# Altium footprint library IC.PCBLIB: 359 footprints (part 12 of 23)
Each footprint in its own frame and in the unit in brackets; x right, y up, seen from the top. Pads: shape width x height; smd on the part's side, far side on the other; paste and mask are expansions set on the pad; w line width, h text height; cw(c..) or ccw(c..) is an arc to the next point about the centre after c.
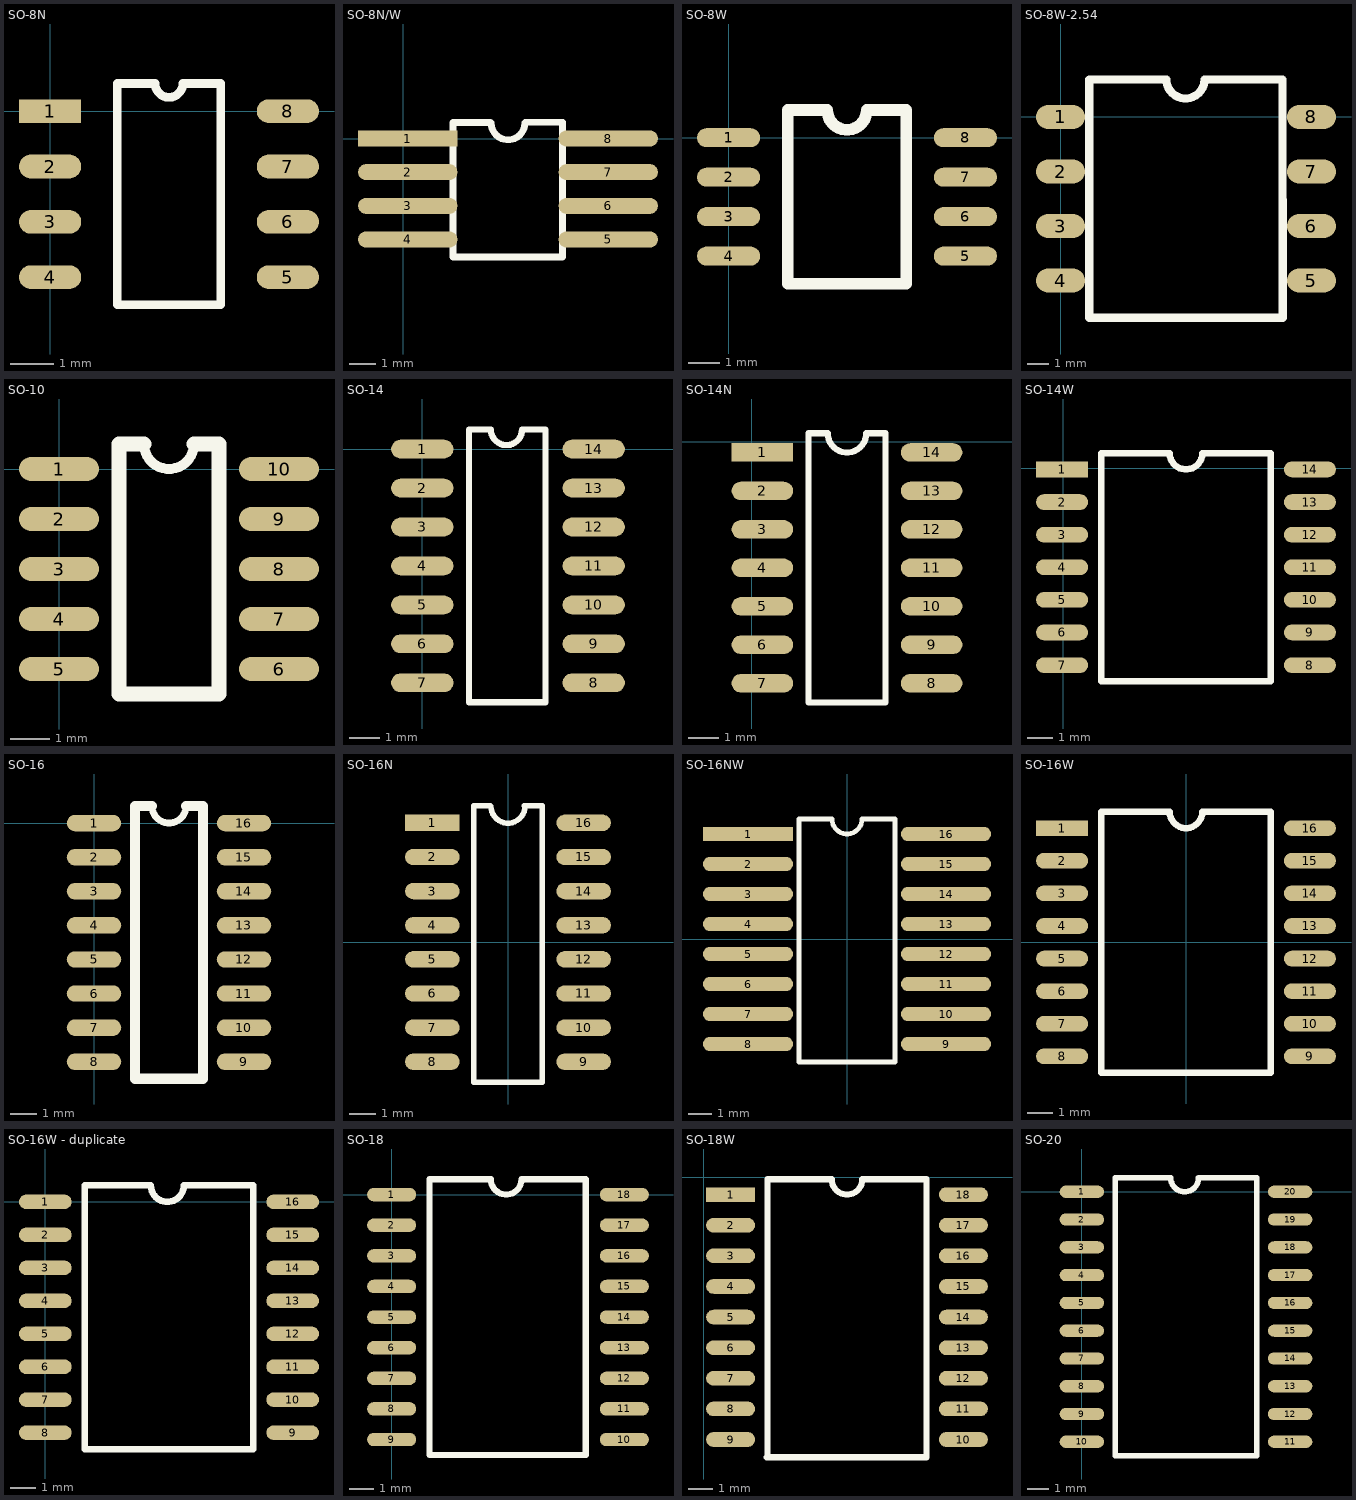
[diagram p11: the footprints below, top view; thin cyan lines are the x and y axes]

## SO-8N [mm]
pads (8):
  rect 1.44x0.55 smd: 1(0,0)
  oval 1.44x0.55 smd: 2(0,-1.28) 3(0,-2.56) 4(0,-3.84) 5(5.5,-3.84) 6(5.5,-2.56) 7(5.5,-1.28) 8(5.5,0)
TopOverlay:
  lines w0.2: 1.555,-4.48 3.945,-4.48 3.945,0.64 3.07,0.64 cw(c2.75,0.64) 2.43,0.64 1.555,0.64 1.555,-4.48

## SO-8N/W [mil]
height 590.55
pads (8):
  rect 147.64x24 smd: 1(6.97,0)
  oval 147.64x24 smd: 2(6.97,-50) 3(6.97,-100) 4(6.97,-150) 5(305,-150) 6(305,-100) 7(305,-50) 8(305,0)
TopOverlay:
  lines w10: 130.06,23.94 74.39,23.94 74.39,-176.06 237.01,-176.06 ; 131,23 ccw(c156,23) 181,23 ; 182,24 237.01,24 ; 236.01,23 237.01,24 ; 237.01,-176 237.01,24

## SO-8W [mil]
pads (8):
  oval 80x24 smd: 1(0,0) 2(0,-50) 3(0,-100) 4(0,-150) 5(300,-150) 6(300,-100) 7(300,-50) 8(300,0)
TopOverlay:
  lines w15: 75,-185 225,-185 225,35 175,35 cw(c150,35) 125,35 75,35 75,-185

## SO-8W-2.54 [mil]
pads (8):
  oval 90x44 smd: 1(0,0) 2(0,-100) 3(0,-200) 4(0,-300) 5(460,-300) 6(460,-200) 7(460,-100) 8(460,0)
TopOverlay:
  lines w15: 52.67,-368.01 52.67,69 194,69 ccw(c229,69) 264,69 407,69 407.33,-368.01 52.67,-368.01

## SO-10 [mil]
pads (10):
  oval 80x24 smd: 1(0,0) 2(0,-50) 3(0,-100) 4(0,-150) 5(0,-200) 6(220,-200) 7(220,-150) 8(220,-100) 9(220,-50) 10(220,0)
TopOverlay:
  lines w10: 85,25 ccw(c110,25) 135,25
  lines w15: 85,25 60,25 60,-225 160,-225 160,25 135,25

## SO-14 [mil]
pads (14):
  oval 80x24 smd: 1(0,0) 2(0,-50) 3(0,-100) 4(0,-150) 5(0,-200) 6(0,-250) 7(0,-300) 8(220,-300) 9(220,-250) 10(220,-200) 11(220,-150) 12(220,-100) 13(220,-50) 14(220,0)
TopOverlay:
  lines w8: 60,-325 158,-325 158,25 128,25 cw(c108,25) 88,25 60,25 60,-325

## SO-14N [mil]
pads (14):
  rect 80x24 smd: 1(14,-14)
  oval 80x24 smd: 2(14,-64) 3(14,-114) 4(14,-164) 5(14,-214) 6(14,-264) 7(14,-314) 8(234,-314) 9(234,-264) 10(234,-214) 11(234,-164) 12(234,-114) 13(234,-64) 14(234,-14)
TopOverlay:
  lines w8: 74,-339 174,-339 174,11 149,11 cw(c124,11) 99,11 74,11 74,-339

## SO-14W [mil]
pads (14):
  rect 80x24 smd: 1(-2,-2)
  oval 80x24 smd: 2(-2,-52) 3(-2,-102) 4(-2,-152) 5(-2,-202) 6(-2,-252) 7(-2,-302) 8(378,-302) 9(378,-252) 10(378,-202) 11(378,-152) 12(378,-102) 13(378,-52) 14(378,-2)
TopOverlay:
  lines w10: 58,-327 58,23 163,23 ccw(c188,23) 213,23 318,23 318,-327 58,-327

## SO-16 [mil]
pads (16):
  oval 80x24 smd: 1(0,0) 2(0,-50) 3(0,-100) 4(0,-150) 5(0,-200) 6(0,-250) 7(0,-300) 8(0,-350) 9(220,-350) 10(220,-300) 11(220,-250) 12(220,-200) 13(220,-150) 14(220,-100) 15(220,-50) 16(220,0)
TopOverlay:
  lines w10: 85,25 ccw(c110,25) 135,25
  lines w15: 85,25 60,25 60,-375 160,-375 160,25 135,25

## SO-16N [mil]
pads (16):
  rect 80x24 smd: 1(-110.95,175)
  oval 80x24 smd: 2(-110.95,125) 3(-110.95,75) 4(-110.95,25) 5(-110.95,-25) 6(-110.95,-75) 7(-110.95,-125) 8(-110.95,-175) 9(110.95,-175) 10(110.95,-125) 11(110.95,-75) 12(110.95,-25) 13(110.95,25) 14(110.95,75) 15(110.95,125) 16(110.95,175)
TopOverlay:
  lines w8: -50.05,199.62 -50.05,-205 49.95,-205 49.95,199.62 ; -50.05,200 -25.95,200 ; -25.05,199.62 ccw(c-0.05,199.62) 24.95,199.62 ; 24.05,200 49.95,200

## SO-16NW [mil]
height 590.55
pads (16):
  rect 150x24 smd: 1(-165,175)
  oval 150x24 smd: 2(-165,125) 3(-165,75) 4(-165,25) 5(-165,-25) 6(-165,-75) 7(-165,-125) 8(-165,-175) 9(165,-175) 10(165,-125) 11(165,-75) 12(165,-25) 13(165,25) 14(165,75) 15(165,125) 16(165,175)
TopOverlay:
  lines w8: -80,-205 -80,200 -25,200 ccw(c0,200) 25,200 80,200 80,-205 -80,-205

## SO-16W [mil]
pads (16):
  rect 80x24 smd: 1(-190,175)
  oval 80x24 smd: 2(-190,125) 3(-190,75) 4(-190,25) 5(-190,-25) 6(-190,-75) 7(-190,-125) 8(-190,-175) 9(190,-175) 10(190,-125) 11(190,-75) 12(190,-25) 13(190,25) 14(190,75) 15(190,125) 16(190,175)
TopOverlay:
  lines w10: -25.28,200 -130,200 -130,-200 130,-200 130,200 25,200 cw(c0,200) -25,200

## SO-16W - duplicate [mil]
pads (16):
  oval 80x22 smd: 1(0,0) 2(0,-50) 3(0,-100) 4(0,-150) 5(0,-200) 6(0,-250) 7(0,-300) 8(0,-350) 9(375,-350) 10(375,-300) 11(375,-250) 12(375,-200) 13(375,-150) 14(375,-100) 15(375,-50) 16(375,0)
TopOverlay:
  lines w10: 60,-375 315,-375 315,25 210,25 cw(c185,25) 160,25 60,25 60,-375

## SO-18 [mil]
pads (18):
  oval 80x22 smd: 1(0,0) 2(0,-50) 3(0,-100) 4(0,-150) 5(0,-200) 6(0,-250) 7(0,-300) 8(0,-350) 9(0,-400) 10(380,-400) 11(380,-350) 12(380,-300) 13(380,-250) 14(380,-200) 15(380,-150) 16(380,-100) 17(380,-50) 18(380,0)
TopOverlay:
  lines w10: 62,-425 62,25 162,25 ccw(c187,25) 212,25 317,25 317,-425 62,-425

## SO-18W [mil]
pads (18):
  rect 80x24 smd: 1(44,-28)
  oval 80x24 smd: 2(44,-78) 3(44,-128) 4(44,-178) 5(44,-228) 6(44,-278) 7(44,-328) 8(44,-378) 9(44,-428) 10(424,-428) 11(424,-378) 12(424,-328) 13(424,-278) 14(424,-228) 15(424,-178) 16(424,-128) 17(424,-78) 18(424,-28)
TopOverlay:
  lines w10: 103,-457 363,-457 ; 104,-457 104,-3 209,-3 ccw(c234,-3) 259,-3 364,-3 364,-457

## SO-20 [mil]
pads (20):
  oval 80x22 smd: 1(0,0) 2(0,-50) 3(0,-100) 4(0,-150) 5(0,-200) 6(0,-250) 7(0,-300) 8(0,-350) 9(0,-400) 10(0,-450) 11(375,-450) 12(375,-400) 13(375,-350) 14(375,-300) 15(375,-250) 16(375,-200) 17(375,-150) 18(375,-100) 19(375,-50) 20(375,0)
TopOverlay:
  lines w10: 60,-475 315,-475 315,25 210,25 cw(c185,25) 160,25 60,25 60,-475